# Altium footprint library cat.PcbLib: 78 footprints (part 3 of 5)
Each footprint in its own frame and in the unit in brackets; x right, y up, seen from the top. Pads: shape width x height; smd on the part's side, far side on the other; paste and mask are expansions set on the pad; w line width, h text height; cw(c..) or ccw(c..) is an arc to the next point about the centre after c.
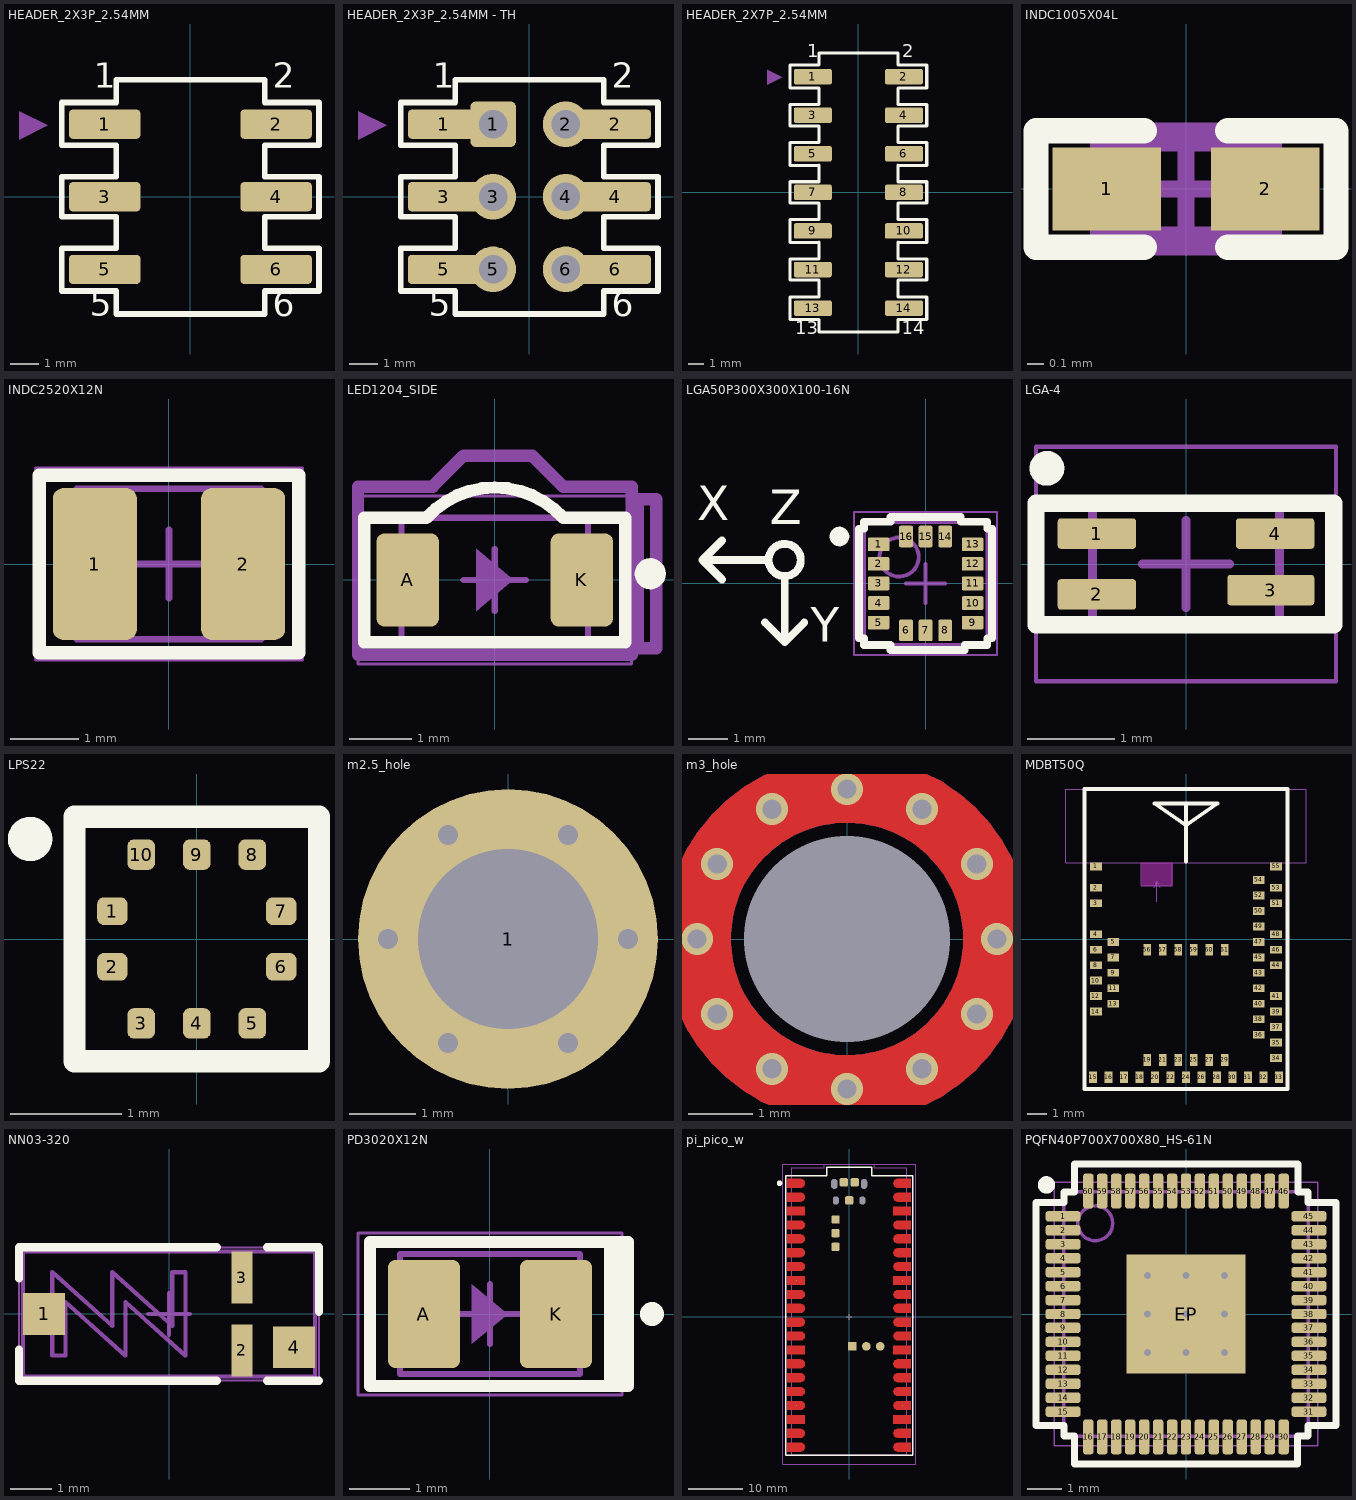
[diagram p2: the footprints below, top view; thin cyan lines are the x and y axes]

## HEADER_2X3P_2.54MM [mm]
pads (6):
  rrect25% 2.5x1.02 smd: 1(-3,2.54) 2(3,2.54) 3(-3,0) 4(3,0) 5(-3,-2.54) 6(3,-2.54)
Top Overlay:
  lines w0.2: -4.5,-3.3 -2.6,-3.3 -2.6,-4.1 2.6,-4.1 2.6,-3.3 4.5,-3.3 4.5,-1.8 2.6,-1.8 2.6,-0.7 4.5,-0.7 4.5,0.7 2.6,0.7 2.6,1.8 4.5,1.8 4.5,3.3 2.6,3.3 2.6,4.1 -2.6,4.1 -2.6,3.3 -4.5,3.3 -4.5,1.8 -2.6,1.8 -2.6,0.7 -4.5,0.7 -4.5,-0.7 -2.6,-0.7 -2.6,-1.8 -4.5,-1.8 -4.5,-3.3
  text "1" at -3.377,3.518 h1.5
  text "2" at 2.881,3.518 h1.5
  text "5" at -3.518,-4.466 h1.5
  text "6" at 2.883,-4.474 h1.5
Mechanical 1:
  region: -5,2.5 -6,2 -6,3
3D body "dw254s-22-06-85.sldprt": height 8.86, standoff 0.01, extent -3.55,-4.064 3.55,4.064

## HEADER_2X3P_2.54MM - TH [mm]
pads (12):
  rrect25% 2.5x1.02 smd: 1(-3,2.54) 2(3,2.54) 3(-3,0) 4(3,0) 5(-3,-2.54) 6(3,-2.54)
  rrect25% 1.6x1.6 / inner rrect25% 1.6x1.6 / far side rrect25% 2x1.6 hole 1: 1(-1.27,2.54)
  round 1.6 / inner round 1.6 / far side oval 2x1.6 hole 1: 2(1.27,2.54) 3(-1.27,0) 4(1.27,0) 5(-1.27,-2.54) 6(1.27,-2.54)
Top Overlay:
  lines w0.2: -4.5,-3.3 -2.6,-3.3 -2.6,-4.1 2.6,-4.1 2.6,-3.3 4.5,-3.3 4.5,-1.8 2.6,-1.8 2.6,-0.7 4.5,-0.7 4.5,0.7 2.6,0.7 2.6,1.8 4.5,1.8 4.5,3.3 2.6,3.3 2.6,4.1 -2.6,4.1 -2.6,3.3 -4.5,3.3 -4.5,1.8 -2.6,1.8 -2.6,0.7 -4.5,0.7 -4.5,-0.7 -2.6,-0.7 -2.6,-1.8 -4.5,-1.8 -4.5,-3.3
  text "1" at -3.377,3.518 h1.5
  text "2" at 2.881,3.518 h1.5
  text "5" at -3.518,-4.466 h1.5
  text "6" at 2.883,-4.474 h1.5
Mechanical 1:
  region: -5,2.5 -6,2 -6,3
3D body "dw254s-22-06-85.sldprt": height 8.86, standoff 0.01, extent -3.55,-4.064 3.55,4.064

## HEADER_2X7P_2.54MM [mm]
pads (14):
  rrect25% 2.5x1.02 smd: 1(-3,7.62) 2(3,7.62) 3(-3,5.08) 4(3,5.08) 5(-3,2.54) 6(3,2.54) 7(-3,0) 8(3,0) 9(-3,-2.54) 10(3,-2.54) 11(-3,-5.08) 12(3,-5.08) 13(-3,-7.62) 14(3,-7.62)
Top Overlay:
  lines w0.2: -2.6,-3.3 -4.5,-3.3 -4.5,-1.8 -2.6,-1.8 -2.6,-0.7 -4.5,-0.7 -4.5,0.7 -2.6,0.7 -2.6,1.8 ; -2.6,-3.28 -2.6,-4.38 -4.5,-4.38 -4.5,-5.78 -2.6,-5.78 -2.6,-6.88 -4.5,-6.88 -4.5,-8.38 -2.6,-8.38 -2.6,-9.18 2.6,-9.18 2.6,-8.38 4.5,-8.38 4.5,-6.88 2.6,-6.88 2.6,-5.78 4.5,-5.78 4.5,-4.38 2.6,-4.38 2.6,-3.28 ; -2.6,1.78 -4.5,1.78 -4.5,3.28 -2.6,3.28 -2.6,4.38 -4.5,4.38 -4.5,5.78 -2.6,5.78 -2.6,6.88 -4.5,6.88 -4.5,8.38 -2.6,8.38 -2.6,9.18 2.6,9.18 2.6,8.38 4.5,8.38 4.5,6.88 2.6,6.88 2.6,5.78 4.5,5.78 4.5,4.38 2.6,4.38 2.6,3.28 4.5,3.28 4.5,1.78 2.6,1.78 ; 2.6,-3.3 4.5,-3.3 4.5,-1.8 2.6,-1.8 2.6,-0.7 4.5,-0.7 4.5,0.7 2.6,0.7 2.6,1.8
  text "13" at -4.143,-9.644 h1.5
  text "14" at 2.86,-9.652 h1.5
  text "1" at -3.377,8.598 h1.5
  text "2" at 2.881,8.598 h1.5
Mechanical 1:
  region: -5,7.58 -6,7.08 -6,8.08

## INDC1005X04L [mm]
pads (2):
  rect 0.65x0.5 smd: 1(-0.475,0) 2(0.475,0)
Top Overlay:
  lines w0.152: -0.25,-0.35 -0.9,-0.35 -0.9,0.35 -0.25,0.35 ; 0.25,-0.35 0.9,-0.35 0.9,0.35 0.25,0.35
Bottom Courtyard:
  lines w0.1: -0.525,-0.275 -0.525,0.275 0.525,0.275 0.525,-0.275 -0.525,-0.275
  text ".Designator" at -0.254,-0.152 h0.3
Mechanical 15:
  lines w0.1: -0.275,0 0.275,0 ; 0,-0.275 0,0.275 ; -0.9,-0.35 -0.9,0.35 0.9,0.35 0.9,-0.35 -0.9,-0.35
3D body "User Library-Chip Inductor 0402.step": height 0.5, standoff 0, extent -0.5,-0.275 0.5,0.325

## INDC2520X12N [mm] "Chip Inductor, 2-Leads, Body 2.50x2.00mm, IPC Medium Density"
height 1.2
pads (2):
  rrect25% 1.23x2.22 smd: 1(-1.085,0) 2(1.085,0)
Top Overlay:
  lines w0.2: -1.9,-1.3 1.9,-1.3 1.9,1.3 -1.9,1.3 -1.9,-1.3
Mechanical 13:
  lines w0.1: -1.35,-1.1 -1.35,1.1 1.35,1.1 1.35,-1.1 -1.35,-1.1
Mechanical 15:
  lines w0.05: -1.95,-1.4 -1.95,1.4 1.95,1.4 1.95,-1.4 -1.95,-1.4
  lines w0.1: -0.5,0 0.5,0 ; 0,-0.5 0,0.5
3D body "INDC2520X12N.step": height 1.2, standoff 0, extent -1.35,-1.1 1.35,1.1

## LED1204_SIDE [mm]
pads (2):
  rrect25% 1x1.5 smd: A(-1.4,0) K(1.4,0)
Top Overlay:
  circle w0.25: c2.5,0.1 r0.125
  lines w0.2: -2.1,-1 -2.1,1 -1.1,1 cw(c0,0) 1.1,1 2.1,1 2.1,-0.9 2.1,-1 -2.1,-1
Mechanical 1:
  region: 0.3,0 -0.3,-0.5 -0.3,0.5
  lines w0.2: -2.2,-1.2 -2.2,1.5 -1,1.5 -0.5,2 0.6,2 1.1,1.5 2.2,1.5 2.2,-1.2 -2.2,-1.2 ; 2.3,-1.1 2.6,-1.1 2.6,1.3 2.3,1.3 2.3,-1.1
Mechanical 13:
  lines w0.1: -1.5,-1 -1.5,1 1.5,1 1.5,-1 -1.5,-1
Mechanical 15:
  lines w0.05: -2.2,-1.35 -2.2,1.35 2.2,1.35 2.2,-1.35 -2.2,-1.35
  lines w0.1: -0.5,0 0.5,0 ; 0,-0.5 0,0.5
3D body "1204_LED_S.step": height 0.99, standoff 0, extent -1.6,-0.254 1.6,1.237

## LGA50P300X300X100-16N [mm] "LGA, 16-Leads, Body 3.00x3.00mm, Pitch 0.50mm, IPC Medium Density"
height 1
pads (16):
  rrect20% 0.55x0.35 smd: 1(-1.2,1) 2(-1.2,0.5) 3(-1.2,0) 4(-1.2,-0.5) 5(-1.2,-1) 9(1.2,-1) 10(1.2,-0.5) 11(1.2,0) 12(1.2,0.5) 13(1.2,1)
  rrect20% 0.35x0.55 smd: 6(-0.5,-1.2) 7(0,-1.2) 8(0.5,-1.2) 14(0.5,1.2) 15(0,1.2) 16(-0.5,1.2)
Top Overlay:
  circle w0.25: c-2.2,1.2 r0.125
  circle w0.2: c-3.6,0.6 r0.412
  lines w0.2: -5.2,0.1 -5.7,0.6 ; -5.2,1.1 -5.7,0.6 ; -4.1,-1 -3.6,-1.5 ; -4.1,0.6 -5.7,0.6 ; -3.6,0.1 -3.6,-1.5 ; -3.1,-1 -3.6,-1.5 ; -1.7,-1.4 -1.575,-1.4 -1.575,-1.575 -0.9,-1.575 -0.9,-1.7 1,-1.7 1,-1.575 1.575,-1.575 1.575,-1.4 1.7,-1.4 1.7,1.4 1.575,1.4 1.575,1.575 0.9,1.575 0.9,1.7 -0.9,1.7 -0.9,1.575 -1.575,1.575 -1.575,1.4 -1.7,1.4 -1.7,-1.4
  text "Y" at -2.94,-1.78 h1.5
  text "X" at -5.841,1.32 h1.5
  text "Z" at -3.98,1.22 h1.5
Mechanical 13:
  circle w0.1: c-0.675,0.675 r0.5
  lines w0.1: -1.575,-1.575 1.575,-1.575 1.575,1.575 -1.575,1.575 -1.575,-1.575
Mechanical 15:
  lines w0.05: -1.825,-1.825 1.825,-1.825 1.825,1.825 -1.825,1.825 -1.825,-1.825
  lines w0.1: -0.5,0 0.5,0 ; 0,-0.5 0,0.5
3D body "LGA50P300X300X100-16N.step": height 1, standoff 0, extent -1.575,-1.575 1.575,1.575

## LGA-4 [mm] "VEML6040A3OG Color Sensor"
height 1.1
pads (4):
  rrect20% 0.9x0.35 smd: 1(-1.025,0.35) 2(-1.025,-0.35) 4(1.025,0.35)
  rrect20% 1x0.35 smd: 3(0.975,-0.3)
Top Overlay:
  circle w0.2: c-1.6,1.1 r0.1
  lines w0.2: -1.725,-0.7 -1.725,0.7 1.7,0.7 1.7,-0.7 -1.725,-0.7
Mechanical 13:
  lines w0.1: -1.075,-0.7 1.075,-0.7 1.075,0.7 -1.075,0.7 -1.075,-0.7
Mechanical 15:
  lines w0.05: -1.725,-1.35 1.725,-1.35 1.725,1.35 -1.725,1.35 -1.725,-1.35
  lines w0.1: -0.5,0 0.5,0 ; 0,-0.5 0,0.5
3D body "VEML6040.stp": height 1, standoff 0, extent -1,-0.625 1,0.625

## LPS22 [mm] "LGA-10"
pads (10):
  rrect50% 0.275x0.25 smd: 1(-0.76,0.25) 2(-0.76,-0.25) 6(0.76,-0.25) 7(0.76,0.25)
  rrect50% 0.25x0.275 smd: 3(-0.5,-0.76) 4(0,-0.76) 5(0.5,-0.76) 8(0.5,0.76) 9(0,0.76) 10(-0.5,0.76)
Top Overlay:
  circle w0.2: c-1.5,0.9 r0.1
  lines w0.2: -1.1,-1.1 1.1,-1.1 1.1,1.1 -1.1,1.1 -1.1,-1.1
3D body "lps22hh_barometer.step": height 0.81, standoff 0.01, extent -1,-1 1,1

## m2.5_hole [mm] "M2.5 hole, with via stitching"
pads (1):
  round 4.5 hole 2.7 unplated mask+1.25: 1(0,0)
via -0.9,-1.559 diameter 0.5 hole 0.3
via 0.9,-1.559 diameter 0.5 hole 0.3
via 1.8,0 diameter 0.5 hole 0.3
via 0.9,1.559 diameter 0.5 hole 0.3
via -0.9,1.559 diameter 0.5 hole 0.3
via -1.8,0 diameter 0.5 hole 0.3

## m3_hole [mm] "M3 hole, with via stitching"
pads (2):
  round 0.1 smd: 1(0,-2.2)
  round 0 hole 3.2 unplated mask+1.25: 1(0,0)
via 0,2.33 diameter 0.5 hole 0.3
via 0,-2.33 diameter 0.5 hole 0.3
via 2.018,1.165 diameter 0.5 hole 0.3
via -2.018,-1.165 diameter 0.5 hole 0.3
via -2.018,1.165 diameter 0.5 hole 0.3
via 2.018,-1.165 diameter 0.5 hole 0.3
via 1.165,2.018 diameter 0.5 hole 0.3
via -1.165,-2.018 diameter 0.5 hole 0.3
via 2.33,0 diameter 0.5 hole 0.3
via -2.33,0 diameter 0.5 hole 0.3
via -1.165,2.018 diameter 0.5 hole 0.3
via 1.165,-2.018 diameter 0.5 hole 0.3
Top Layer:
  circle w1.05: c0,0 r2.33
Bottom Layer:
  circle w1.05: c0,0 r2.33
Multi-Layer:
  pour cut-out: 0,-1.8 0.177,-1.8 0.526,-1.731 0.854,-1.596 1.149,-1.399 1.4,-1.148 1.598,-0.853 1.734,-0.525 1.803,-0.177 1.803,0 1.8,0 1.8,0.177 1.731,0.525 1.596,0.852 1.4,1.147 1.149,1.397 0.855,1.595 0.528,1.73 0.18,1.8 0.003,1.8 0,1.8 -0.177,1.8 -0.524,1.73 -0.852,1.595 -1.146,1.397 -1.396,1.147 -1.593,0.852 -1.728,0.525 -1.797,0.177 -1.797,0 -1.8,0 -1.8,-0.177 -1.73,-0.525 -1.594,-0.853 -1.397,-1.148 -1.146,-1.399 -0.85,-1.596 -0.522,-1.731 -0.174,-1.8 0.003,-1.8

## MDBT50Q [mm]
pads (61):
  rect 0.6x0.4 smd mask+0.05: 1(-4.65,3.75) 2(-4.65,2.65) 3(-4.65,1.85) 4(-4.65,0.25) 5(-3.75,-0.15) 6(-4.65,-0.55) 7(-3.75,-0.95) 8(-4.65,-1.35) 9(-3.75,-1.75) 10(-4.65,-2.15) 11(-3.75,-2.55) 12(-4.65,-2.95) 13(-3.75,-3.35) 14(-4.65,-3.75) 34(4.65,-6.15) 35(4.65,-5.35) 36(3.75,-4.95) 37(4.65,-4.55) 38(3.75,-4.15) 39(4.65,-3.75) 40(3.75,-3.35) 41(4.65,-2.95) 42(3.75,-2.55) 43(3.75,-1.75) 44(4.65,-1.35) 45(3.75,-0.95) 46(4.65,-0.55) 47(3.75,-0.15) 48(4.65,0.25) 49(3.75,0.65) 50(3.75,1.45) 51(4.65,1.85) 52(3.75,2.25) 53(4.65,2.65) 54(3.75,3.05) 55(4.65,3.75)
  rect 0.4x0.6 smd mask+0.05: 15(-4.8,-7.15) 16(-4,-7.15) 17(-3.2,-7.15) 18(-2.4,-7.15) 19(-2,-6.25) 20(-1.6,-7.15) 21(-1.2,-6.25) 22(-0.8,-7.15) 23(-0.4,-6.25) 24(0,-7.15) 25(0.4,-6.25) 26(0.8,-7.15) 27(1.2,-6.25) 28(1.6,-7.15) 29(2,-6.25) 30(2.4,-7.15) 31(3.2,-7.15) 32(4,-7.15) 33(4.8,-7.15) 56(-2,-0.55) 57(-1.2,-0.55) 58(-0.4,-0.55) 59(0.4,-0.55) 60(1.2,-0.55) 61(2,-0.55)
Top Layer keep-out:
  rectangle: -2.3,2.75 -0.7,3.95
Top Overlay:
  lines w0.2: 0,4 0,7 ; 0,7 -1.625,7 0,5.875 1.625,7 0,7 ; -5.25,-7.75 -5.25,7.75 5.25,7.75 5.25,-7.75 -5.25,-7.75
Bottom Courtyard:
  lines w0.05: -1.65,2.652 -1.5,2.952 ; -1.5,1.927 -1.5,2.952 ; -1.35,2.652 -1.5,2.952 ; -6.2,3.95 -6.2,7.75 6.2,7.75 6.2,3.95 -6.2,3.95 ; -2.3,2.75 -2.3,3.95 -0.7,3.95 -0.7,2.75 -2.3,2.75
  text "No ground pad" at -2.801,5.975 h0.45
  text "Toplayer no ground pad" at -3.4,1.525 h0.3
3D body "mdbt50q.sldprt": height 2.05, standoff 0, extent -5.25,-7.75 5.25,7.75

## NN03-320 [mm]
pads (4):
  rect 1x1 smd: 1(-3,0) 4(3,-0.8)
  rect 0.5x1.25 smd: 2(1.75,-0.875) 3(1.75,0.875)
Top Overlay:
  lines w0.2: -3.6,-0.852 -3.6,-1.6 1.148,-1.6 ; -3.6,0.852 -3.6,1.6 1.148,1.6 ; 2.352,-1.6 3.6,-1.6 ; 2.352,1.6 3.6,1.6 3.6,0.052
Bottom Courtyard:
  circle w0.1: c3,-0.75 r0.25
  lines w0.1: -3.5,-1.5 -3.5,1.5 3.5,1.5 3.5,-1.5 -3.5,-1.5 ; -2.8,-1 -2.48,-1 -2.48,0.285 -1.04,-1 -1.04,0.285 0.4,-1 0.4,1 0.08,1 0.08,-0.285 -1.36,1 -1.36,-0.285 -2.8,1 -2.8,-1
  text ".Designator" at 0.828,1.55 h0.31
Mechanical 15:
  lines w0.05: -3.6,-1.6 -3.6,1.6 3.6,1.6 3.6,-1.6 -3.6,-1.6
  lines w0.1: -0.5,0 0.5,0 ; 0,-0.5 0,0.5
Multi-Layer:
  pour cut-out: -3.5,1.5 3.5,1.5 3.5,-1.5 -3.5,-1.5
3D body "NN03-320.stp": height 2.01, standoff -0.01, extent -3.5,-1.5 3.5,1.5

## PD3020X12N [mm] "Photodiode, 2-Leads, Body 3.00x2.00mm, IPC Medium Density"
height 1.2
pads (2):
  rrect20% 1.2x1.8 smd: A(-1.1,0) K(1.1,0)
Top Overlay:
  circle w0.2: c2.7,0 r0.1
  rectangle: 2,-1.2 2.3,1.2
  lines w0.2: 2,-1.2 2.3,-1.2 2.3,1.2 2,1.2 ; 2,-1.2 -2,-1.2 -2,1.2 2,1.2 ; 2,-1.2 2,1.2
Mechanical 1:
  region: 0.3,0 -0.3,-0.5 -0.3,0.5
  lines w0.2: 2,-1.2 2.3,-1.2 2.3,1.2 2,1.2 ; 2,-1.2 2,1.2 ; 2,-1.2 -2,-1.2 -2,1.2 2,1.2 ; 2,-1.2 2,1.2
Mechanical 13:
  lines w0.1: -1.5,-1 -1.5,1 1.5,1 1.5,-1 -1.5,-1
Mechanical 15:
  lines w0.05: -2.2,-1.35 -2.2,1.35 2.2,1.35 2.2,-1.35 -2.2,-1.35
  lines w0.1: -0.5,0 0.5,0 ; 0,-0.5 0,0.5
3D body "zspd-z3020b-29c-z5.sldprt": height 2.9, standoff 0, extent -1.5,-1 1.5,1

## pi_pico_w [mm] "RASPBERRY PI PICO W RP2040 BOARD"
height 1
pads (53):
  round 0.025 smd: 1(-9.69,24.415) 2(-9.69,21.875) 3(-9.69,19.335) 4(-9.69,16.795) 5(-9.69,14.255) 6(-9.69,11.715) 7(-9.69,9.175) 8(-9.69,6.635) 9(-9.69,4.095) 10(-9.69,1.555) 11(-9.69,-0.985) 12(-9.69,-3.525) 13(-9.69,-6.065) 14(-9.69,-8.605) 15(-9.69,-11.145) 16(-9.69,-13.685) 17(-9.69,-16.225) 18(-9.69,-18.765) 19(-9.69,-21.305) 20(-9.69,-23.845) 21(9.69,-23.845) 22(9.69,-21.305) 23(9.69,-18.765) 24(9.69,-16.225) 25(9.69,-13.685) 26(9.69,-11.145) 27(9.69,-8.605) 28(9.69,-6.065) 29(9.69,-3.525) 30(9.69,-0.985) 31(9.69,1.555) 32(9.69,4.095) 33(9.69,6.635) 34(9.69,9.175) 35(9.69,11.715) 36(9.69,14.255) 37(9.69,16.795) 38(9.69,19.335) 39(9.69,21.875) 40(9.69,24.415)
  rect 1.575x1.575 smd: 41(0.594,-5.408)
  round 1.575 smd: 42(3.134,-5.408) 43(5.674,-5.408)
  rrect30% 1.5x1.5 smd: 44(0.01,21.292) 45(1.01,24.592) 46(-0.99,24.592) 47(-2.49,17.792) 48(-2.49,15.292) 49(-2.49,12.792)
  round 0 hole 1.1 slot 1.8 at 90 deg unplated: ""(-2.715,24.292) ""(2.715,24.292)
  round 0 hole 1.05 slot 1.45 at 90 deg unplated: ""(-2.425,21.262) ""(2.425,21.262)
Top Layer:
  region: -11.29,-24.645 -11.29,-23.045 -8.89,-23.045 -8.827,-23.045 -8.703,-23.065 -8.583,-23.104 -8.471,-23.161 -8.369,-23.235 -8.28,-23.324 -8.206,-23.426 -8.149,-23.538 -8.11,-23.658 -8.09,-23.782 -8.09,-23.908 -8.11,-24.032 -8.149,-24.152 -8.206,-24.264 -8.28,-24.366 -8.369,-24.455 -8.471,-24.529 -8.583,-24.586 -8.703,-24.625 -8.827,-24.645 -8.89,-24.645
  region: -11.29,-22.105 -11.29,-20.505 -8.89,-20.505 -8.827,-20.505 -8.703,-20.525 -8.583,-20.564 -8.471,-20.621 -8.369,-20.695 -8.28,-20.784 -8.206,-20.886 -8.149,-20.998 -8.11,-21.118 -8.09,-21.242 -8.09,-21.368 -8.11,-21.492 -8.149,-21.612 -8.206,-21.724 -8.28,-21.826 -8.369,-21.915 -8.471,-21.989 -8.583,-22.046 -8.703,-22.085 -8.827,-22.105 -8.89,-22.105
  region: -11.29,-17.025 -11.29,-15.425 -8.89,-15.425 -8.827,-15.425 -8.703,-15.445 -8.583,-15.484 -8.471,-15.541 -8.369,-15.615 -8.28,-15.704 -8.206,-15.806 -8.149,-15.918 -8.11,-16.038 -8.09,-16.162 -8.09,-16.288 -8.11,-16.412 -8.149,-16.532 -8.206,-16.644 -8.28,-16.746 -8.369,-16.835 -8.471,-16.909 -8.583,-16.966 -8.703,-17.005 -8.827,-17.025 -8.89,-17.025
  region: -11.29,-14.485 -11.29,-12.885 -8.89,-12.885 -8.827,-12.885 -8.703,-12.905 -8.583,-12.944 -8.471,-13.001 -8.369,-13.075 -8.28,-13.164 -8.206,-13.266 -8.149,-13.378 -8.11,-13.498 -8.09,-13.622 -8.09,-13.748 -8.11,-13.872 -8.149,-13.992 -8.206,-14.104 -8.28,-14.206 -8.369,-14.295 -8.471,-14.369 -8.583,-14.426 -8.703,-14.465 -8.827,-14.485 -8.89,-14.485
  region: -11.29,-11.945 -11.29,-10.345 -8.89,-10.345 -8.827,-10.345 -8.703,-10.365 -8.583,-10.404 -8.471,-10.461 -8.369,-10.535 -8.28,-10.624 -8.206,-10.726 -8.149,-10.838 -8.11,-10.958 -8.09,-11.082 -8.09,-11.208 -8.11,-11.332 -8.149,-11.452 -8.206,-11.564 -8.28,-11.666 -8.369,-11.755 -8.471,-11.829 -8.583,-11.886 -8.703,-11.925 -8.827,-11.945 -8.89,-11.945
  region: -11.29,-9.405 -11.29,-7.805 -8.89,-7.805 -8.827,-7.805 -8.703,-7.825 -8.583,-7.864 -8.471,-7.921 -8.369,-7.995 -8.28,-8.084 -8.206,-8.186 -8.149,-8.298 -8.11,-8.418 -8.09,-8.542 -8.09,-8.668 -8.11,-8.792 -8.149,-8.912 -8.206,-9.024 -8.28,-9.126 -8.369,-9.215 -8.471,-9.289 -8.583,-9.346 -8.703,-9.385 -8.827,-9.405 -8.89,-9.405
  region: -11.29,-4.325 -11.29,-2.725 -8.89,-2.725 -8.827,-2.725 -8.703,-2.745 -8.583,-2.784 -8.471,-2.841 -8.369,-2.915 -8.28,-3.004 -8.206,-3.106 -8.149,-3.218 -8.11,-3.338 -8.09,-3.462 -8.09,-3.588 -8.11,-3.712 -8.149,-3.832 -8.206,-3.944 -8.28,-4.046 -8.369,-4.135 -8.471,-4.209 -8.583,-4.266 -8.703,-4.305 -8.827,-4.325 -8.89,-4.325
  region: -11.29,-1.785 -11.29,-0.185 -8.89,-0.185 -8.827,-0.185 -8.703,-0.205 -8.583,-0.244 -8.471,-0.301 -8.369,-0.375 -8.28,-0.464 -8.206,-0.566 -8.149,-0.678 -8.11,-0.798 -8.09,-0.922 -8.09,-1.048 -8.11,-1.172 -8.149,-1.292 -8.206,-1.404 -8.28,-1.506 -8.369,-1.595 -8.471,-1.669 -8.583,-1.726 -8.703,-1.765 -8.827,-1.785 -8.89,-1.785
  region: -11.29,0.755 -11.29,2.355 -8.89,2.355 -8.827,2.355 -8.703,2.335 -8.583,2.296 -8.471,2.239 -8.369,2.165 -8.28,2.076 -8.206,1.974 -8.149,1.862 -8.11,1.742 -8.09,1.618 -8.09,1.492 -8.11,1.368 -8.149,1.248 -8.206,1.136 -8.28,1.034 -8.369,0.945 -8.471,0.871 -8.583,0.814 -8.703,0.775 -8.827,0.755 -8.89,0.755
  region: -11.29,3.295 -11.29,4.895 -8.89,4.895 -8.827,4.895 -8.703,4.875 -8.583,4.836 -8.471,4.779 -8.369,4.705 -8.28,4.616 -8.206,4.514 -8.149,4.402 -8.11,4.282 -8.09,4.158 -8.09,4.032 -8.11,3.908 -8.149,3.788 -8.206,3.676 -8.28,3.574 -8.369,3.485 -8.471,3.411 -8.583,3.354 -8.703,3.315 -8.827,3.295 -8.89,3.295
  region: -11.286,5.835 -11.286,7.435 -8.094,7.435 -8.094,5.835
  region: -11.29,8.375 -11.29,9.975 -8.89,9.975 -8.827,9.975 -8.703,9.955 -8.583,9.916 -8.471,9.859 -8.369,9.785 -8.28,9.696 -8.206,9.594 -8.149,9.482 -8.11,9.362 -8.09,9.238 -8.09,9.112 -8.11,8.988 -8.149,8.868 -8.206,8.756 -8.28,8.654 -8.369,8.565 -8.471,8.491 -8.583,8.434 -8.703,8.395 -8.827,8.375 -8.89,8.375
  region: -11.29,10.915 -11.29,12.515 -8.89,12.515 -8.827,12.515 -8.703,12.495 -8.583,12.456 -8.471,12.399 -8.369,12.325 -8.28,12.236 -8.206,12.134 -8.149,12.022 -8.11,11.902 -8.09,11.778 -8.09,11.652 -8.11,11.528 -8.149,11.408 -8.206,11.296 -8.28,11.194 -8.369,11.105 -8.471,11.031 -8.583,10.974 -8.703,10.935 -8.827,10.915 -8.89,10.915
  region: -11.29,13.455 -11.29,15.055 -8.89,15.055 -8.827,15.055 -8.703,15.035 -8.583,14.996 -8.471,14.939 -8.369,14.865 -8.28,14.776 -8.206,14.674 -8.149,14.562 -8.11,14.442 -8.09,14.318 -8.09,14.192 -8.11,14.068 -8.149,13.948 -8.206,13.836 -8.28,13.734 -8.369,13.645 -8.471,13.571 -8.583,13.514 -8.703,13.475 -8.827,13.455 -8.89,13.455
  region: -11.29,15.995 -11.29,17.595 -8.89,17.595 -8.827,17.595 -8.703,17.575 -8.583,17.536 -8.471,17.479 -8.369,17.405 -8.28,17.316 -8.206,17.214 -8.149,17.102 -8.11,16.982 -8.09,16.858 -8.09,16.732 -8.11,16.608 -8.149,16.488 -8.206,16.376 -8.28,16.274 -8.369,16.185 -8.471,16.111 -8.583,16.054 -8.703,16.015 -8.827,15.995 -8.89,15.995
  region: -11.29,21.075 -11.29,22.675 -8.89,22.675 -8.827,22.675 -8.703,22.655 -8.583,22.616 -8.471,22.559 -8.369,22.485 -8.28,22.396 -8.206,22.294 -8.149,22.182 -8.11,22.062 -8.09,21.938 -8.09,21.812 -8.11,21.688 -8.149,21.568 -8.206,21.456 -8.28,21.354 -8.369,21.265 -8.471,21.191 -8.583,21.134 -8.703,21.095 -8.827,21.075 -8.89,21.075
  region: -11.29,23.615 -11.29,25.215 -8.89,25.215 -8.827,25.215 -8.703,25.195 -8.583,25.156 -8.471,25.099 -8.369,25.025 -8.28,24.936 -8.206,24.834 -8.149,24.722 -8.11,24.602 -8.09,24.478 -8.09,24.352 -8.11,24.228 -8.149,24.108 -8.206,23.996 -8.28,23.894 -8.369,23.805 -8.471,23.731 -8.583,23.674 -8.703,23.635 -8.827,23.615 -8.89,23.615
  region: 11.29,4.895 11.29,3.295 8.89,3.295 8.827,3.295 8.703,3.315 8.583,3.354 8.471,3.411 8.369,3.485 8.28,3.574 8.206,3.676 8.149,3.788 8.11,3.908 8.09,4.032 8.09,4.158 8.11,4.282 8.149,4.402 8.206,4.514 8.28,4.616 8.369,4.705 8.471,4.779 8.583,4.836 8.703,4.875 8.827,4.895 8.89,4.895
  region: 11.29,2.355 11.29,0.755 8.89,0.755 8.827,0.755 8.703,0.775 8.583,0.814 8.471,0.871 8.369,0.945 8.28,1.034 8.206,1.136 8.149,1.248 8.11,1.368 8.09,1.492 8.09,1.618 8.11,1.742 8.149,1.862 8.206,1.974 8.28,2.076 8.369,2.165 8.471,2.239 8.583,2.296 8.703,2.335 8.827,2.355 8.89,2.355
  region: 11.29,-0.185 11.29,-1.785 8.89,-1.785 8.827,-1.785 8.703,-1.765 8.583,-1.726 8.471,-1.669 8.369,-1.595 8.28,-1.506 8.206,-1.404 8.149,-1.292 8.11,-1.172 8.09,-1.048 8.09,-0.922 8.11,-0.798 8.149,-0.678 8.206,-0.566 8.28,-0.464 8.369,-0.375 8.471,-0.301 8.583,-0.244 8.703,-0.205 8.827,-0.185 8.89,-0.185
  region: 11.29,-2.725 11.29,-4.325 8.89,-4.325 8.827,-4.325 8.703,-4.305 8.583,-4.266 8.471,-4.209 8.369,-4.135 8.28,-4.046 8.206,-3.944 8.149,-3.832 8.11,-3.712 8.09,-3.588 8.09,-3.462 8.11,-3.338 8.149,-3.218 8.206,-3.106 8.28,-3.004 8.369,-2.915 8.471,-2.841 8.583,-2.784 8.703,-2.745 8.827,-2.725 8.89,-2.725
  region: 11.29,12.515 11.29,10.915 8.89,10.915 8.827,10.915 8.703,10.935 8.583,10.974 8.471,11.031 8.369,11.105 8.28,11.194 8.206,11.296 8.149,11.408 8.11,11.528 8.09,11.652 8.09,11.778 8.11,11.902 8.149,12.022 8.206,12.134 8.28,12.236 8.369,12.325 8.471,12.399 8.583,12.456 8.703,12.495 8.827,12.515 8.89,12.515
  region: 11.29,-23.045 11.29,-24.645 8.89,-24.645 8.827,-24.645 8.703,-24.625 8.583,-24.586 8.471,-24.529 8.369,-24.455 8.28,-24.366 8.206,-24.264 8.149,-24.152 8.11,-24.032 8.09,-23.908 8.09,-23.782 8.11,-23.658 8.149,-23.538 8.206,-23.426 8.28,-23.324 8.369,-23.235 8.471,-23.161 8.583,-23.104 8.703,-23.065 8.827,-23.045 8.89,-23.045
  region: 11.29,17.595 11.29,15.995 8.89,15.995 8.827,15.995 8.703,16.015 8.583,16.054 8.471,16.111 8.369,16.185 8.28,16.274 8.206,16.376 8.149,16.488 8.11,16.608 8.09,16.732 8.09,16.858 8.11,16.982 8.149,17.102 8.206,17.214 8.28,17.316 8.369,17.405 8.471,17.479 8.583,17.536 8.703,17.575 8.827,17.595 8.89,17.595
  region: 11.29,15.055 11.29,13.455 8.89,13.455 8.827,13.455 8.703,13.475 8.583,13.514 8.471,13.571 8.369,13.645 8.28,13.734 8.206,13.836 8.149,13.948 8.11,14.068 8.09,14.192 8.09,14.318 8.11,14.442 8.149,14.562 8.206,14.674 8.28,14.776 8.369,14.865 8.471,14.939 8.583,14.996 8.703,15.035 8.827,15.055 8.89,15.055
  region: 11.29,22.675 11.29,21.075 8.89,21.075 8.827,21.075 8.703,21.095 8.583,21.134 8.471,21.191 8.369,21.265 8.28,21.354 8.206,21.456 8.149,21.568 8.11,21.688 8.09,21.812 8.09,21.938 8.11,22.062 8.149,22.182 8.206,22.294 8.28,22.396 8.369,22.485 8.471,22.559 8.583,22.616 8.703,22.655 8.827,22.675 8.89,22.675
  region: 11.29,9.975 11.29,8.375 8.89,8.375 8.827,8.375 8.703,8.395 8.583,8.434 8.471,8.491 8.369,8.565 8.28,8.654 8.206,8.756 8.149,8.868 8.11,8.988 8.09,9.112 8.09,9.238 8.11,9.362 8.149,9.482 8.206,9.594 8.28,9.696 8.369,9.785 8.471,9.859 8.583,9.916 8.703,9.955 8.827,9.975 8.89,9.975
  region: 11.29,-7.805 11.29,-9.405 8.89,-9.405 8.827,-9.405 8.703,-9.385 8.583,-9.346 8.471,-9.289 8.369,-9.215 8.28,-9.126 8.206,-9.024 8.149,-8.912 8.11,-8.792 8.09,-8.668 8.09,-8.542 8.11,-8.418 8.149,-8.298 8.206,-8.186 8.28,-8.084 8.369,-7.995 8.471,-7.921 8.583,-7.864 8.703,-7.825 8.827,-7.805 8.89,-7.805
  region: 11.29,-10.345 11.29,-11.945 8.89,-11.945 8.827,-11.945 8.703,-11.925 8.583,-11.886 8.471,-11.829 8.369,-11.755 8.28,-11.666 8.206,-11.564 8.149,-11.452 8.11,-11.332 8.09,-11.208 8.09,-11.082 8.11,-10.958 8.149,-10.838 8.206,-10.726 8.28,-10.624 8.369,-10.535 8.471,-10.461 8.583,-10.404 8.703,-10.365 8.827,-10.345 8.89,-10.345
  region: 11.29,-12.885 11.29,-14.485 8.89,-14.485 8.827,-14.485 8.703,-14.465 8.583,-14.426 8.471,-14.369 8.369,-14.295 8.28,-14.206 8.206,-14.104 8.149,-13.992 8.11,-13.872 8.09,-13.748 8.09,-13.622 8.11,-13.498 8.149,-13.378 8.206,-13.266 8.28,-13.164 8.369,-13.075 8.471,-13.001 8.583,-12.944 8.703,-12.905 8.827,-12.885 8.89,-12.885
  region: 11.29,-15.425 11.29,-17.025 8.89,-17.025 8.827,-17.025 8.703,-17.005 8.583,-16.966 8.471,-16.909 8.369,-16.835 8.28,-16.746 8.206,-16.644 8.149,-16.532 8.11,-16.412 8.09,-16.288 8.09,-16.162 8.11,-16.038 8.149,-15.918 8.206,-15.806 8.28,-15.704 8.369,-15.615 8.471,-15.541 8.583,-15.484 8.703,-15.445 8.827,-15.425 8.89,-15.425
  region: 11.29,-20.505 11.29,-22.105 8.89,-22.105 8.827,-22.105 8.703,-22.085 8.583,-22.046 8.471,-21.989 8.369,-21.915 8.28,-21.826 8.206,-21.724 8.149,-21.612 8.11,-21.492 8.09,-21.368 8.09,-21.242 8.11,-21.118 8.149,-20.998 8.206,-20.886 8.28,-20.784 8.369,-20.695 8.471,-20.621 8.583,-20.564 8.703,-20.525 8.827,-20.505 8.89,-20.505
  region: 11.29,25.215 11.29,23.615 8.89,23.615 8.827,23.615 8.703,23.635 8.583,23.674 8.471,23.731 8.369,23.805 8.28,23.894 8.206,23.996 8.149,24.108 8.11,24.228 8.09,24.352 8.09,24.478 8.11,24.602 8.149,24.722 8.206,24.834 8.28,24.936 8.369,25.025 8.471,25.099 8.583,25.156 8.703,25.195 8.827,25.215 8.89,25.215
  region: -11.286,18.535 -11.286,20.135 -8.094,20.135 -8.094,18.535
  region: 11.286,20.135 11.286,18.535 8.094,18.535 8.094,20.135
  region: 11.286,7.435 11.286,5.835 8.094,5.835 8.094,7.435
  region: 11.286,-5.265 11.286,-6.865 8.094,-6.865 8.094,-5.265
  region: -11.286,-6.865 -11.286,-5.265 -8.094,-5.265 -8.094,-6.865
  region: -11.286,-19.565 -11.286,-17.965 -8.094,-17.965 -8.094,-19.565
  region: 11.286,-17.965 11.286,-19.565 8.094,-19.565 8.094,-17.965
Top Overlay:
  circle w0.508: c-12.738,24.415 r0.254
  lines w0.254: -11.6,-25.3 11.6,-25.3 11.6,25.8 4.1,25.8 4.1,27.324 -4.1,27.324 -4.1,25.8 -11.6,25.8 -11.6,-25.3
Mechanical 13:
  lines w0.1: -10.49,-25.208 10.51,-25.208 10.51,27.218 4.572,27.218 4.572,27.94 -3.048,27.94 -4.572,27.94 -4.572,27.218 -10.49,27.218 -10.49,-25.208
Mechanical 15:
  lines w0.05: -0.5,0 0.5,0 ; 0,-0.5 0,0.5 ; -12.192,-26.924 12.192,-26.924 12.192,27.94 -12.192,27.94 -12.192,-26.924
3D body "pi_pico_w.step": height 3.62, standoff 0.01, extent -10.5,-25.25 10.5,27.1

## PQFN40P700X700X80_HS-61N [mm] "PQFN, 60-Leads, Body 7.00x7.00mm, Pitch 0.40mm, Thermal Pad 3.40x3.40mm, IPC Medium Density"
height 0.8
pads (61):
  rrect50% 1x0.3 smd: 1(-3.525,2.8) 2(-3.525,2.4) 3(-3.525,2) 4(-3.525,1.6) 5(-3.525,1.2) 6(-3.525,0.8) 7(-3.525,0.4) 8(-3.525,0) 9(-3.525,-0.4) 10(-3.525,-0.8) 11(-3.525,-1.2) 12(-3.525,-1.6) 13(-3.525,-2) 14(-3.525,-2.4) 15(-3.525,-2.8) 31(3.525,-2.8) 32(3.525,-2.4) 33(3.525,-2) 34(3.525,-1.6) 35(3.525,-1.2) 36(3.525,-0.8) 37(3.525,-0.4) 38(3.525,0) 39(3.525,0.4) 40(3.525,0.8) 41(3.525,1.2) 42(3.525,1.6) 43(3.525,2) 44(3.525,2.4) 45(3.525,2.8)
  rrect50% 0.3x1 smd: 16(-2.8,-3.525) 17(-2.4,-3.525) 18(-2,-3.525) 19(-1.6,-3.525) 20(-1.2,-3.525) 21(-0.8,-3.525) 22(-0.4,-3.525) 23(0,-3.525) 24(0.4,-3.525) 25(0.8,-3.525) 26(1.2,-3.525) 27(1.6,-3.525) 28(2,-3.525) 29(2.4,-3.525) 30(2.8,-3.525) 46(2.8,3.525) 47(2.4,3.525) 48(2,3.525) 49(1.6,3.525) 50(1.2,3.525) 51(0.8,3.525) 52(0.4,3.525) 53(0,3.525) 54(-0.4,3.525) 55(-0.8,3.525) 56(-1.2,3.525) 57(-1.6,3.525) 58(-2,3.525) 59(-2.4,3.525) 60(-2.8,3.525)
  rect 3.4x3.4 smd: EP(0,0)
via -1.1,1.1 diameter 0.5 hole 0.2
via 0,1.1 diameter 0.5 hole 0.2
via 1.1,1.1 diameter 0.5 hole 0.2
via -1.1,0 diameter 0.5 hole 0.2
via 0,0 diameter 0.5 hole 0.2
via 1.1,0 diameter 0.5 hole 0.2
via -1.1,-1.1 diameter 0.5 hole 0.2
via 0,-1.1 diameter 0.5 hole 0.2
via 1.1,-1.1 diameter 0.5 hole 0.2
Top Overlay:
  circle w0.25: c-4,3.7 r0.125
  lines w0.2: -4.3,-3.2 -3.5,-3.2 -3.5,-3.5 -3.2,-3.5 -3.2,-4.3 3.2,-4.3 3.2,-3.5 3.5,-3.5 3.5,-3.2 4.3,-3.2 4.3,3.2 3.5,3.2 3.5,3.5 3.212,3.5 3.212,4.3 -3.2,4.3 -3.2,3.5 -3.5,3.5 -3.5,3.2 -4.3,3.2 -4.3,-3.2
Mechanical 13:
  circle w0.1: c-2.6,2.6 r0.5
  lines w0.1: -3.5,-3.5 -3.5,3.5 3.5,3.5 3.5,-3.5 -3.5,-3.5
Mechanical 15:
  lines w0.05: -3.775,-3.775 -3.775,3.775 3.775,3.775 3.775,-3.775 -3.775,-3.775
  lines w0.1: -0.5,0 0.5,0 ; 0,-0.5 0,0.5
3D body "PQFN40P700X700X80_HS-61N.step": height 0.8, standoff 0, extent -3.5,-3.5 3.5,3.5